# Altium integrated library FPC_Connector.IntLib: 212 symbols (part 1 of 2) (continued)
## 686124148922 (continued)
SMT ZIF Horizontal - Bottom Contact - 1.00 mm Hinge Type - WR-FPC, 24 pins; Part Number: 686124148922; Pitch: 1 mm; Pin Number: 24; ComponentLink1Description: Manufacturer; ComponentLink1URL: http://www.we-online.de; ComponentLink2Description: Datasheet; ComponentLink2URL: http://katalog.we-online.com/em/datasheet/6861xx148922.pdf; Published Date: April 2017; Publisher: Wurth Elektronik
footprint 686124148922 (SMT ZIF Horizontal - Bottom Contact - 1.00 mm Hinge Type, 24p)
pins: 1, 2, 3, 4, 5, 6, 7, 8, 9, 10, 11, 12, 13, 14, 15, 16, 17, 18, 19, 20, 21, 22, 23, 24

## 686126148922
designator J?
SMT ZIF Horizontal - Bottom Contact - 1.00 mm Hinge Type - WR-FPC, 26 pins; Part Number: 686126148922; Pitch: 1 mm; Pin Number: 26; ComponentLink1Description: Manufacturer; ComponentLink1URL: http://www.we-online.de; ComponentLink2Description: Datasheet; ComponentLink2URL: http://katalog.we-online.com/em/datasheet/6861xx148922.pdf; Published Date: April 2017; Publisher: Wurth Elektronik
footprint 686126148922 (SMT ZIF Horizontal - Bottom Contact - 1.00 mm Hinge Type, 26p)
pins: 1, 2, 3, 4, 5, 6, 7, 8, 9, 10, 11, 12, 13, 14, 15, 16, 17, 18, 19, 20, 21, 22, 23, 24, 25, 26

## 686128148922
designator J?
SMT ZIF Horizontal - Bottom Contact - 1.00 mm Hinge Type - WR-FPC, 28 pins; Part Number: 686128148922; Pitch: 1 mm; Pin Number: 28; ComponentLink1Description: Manufacturer; ComponentLink1URL: http://www.we-online.de; ComponentLink2Description: Datasheet; ComponentLink2URL: http://katalog.we-online.com/em/datasheet/6861xx148922.pdf; Published Date: April 2017; Publisher: Wurth Elektronik
footprint 686128148922 (SMT ZIF Horizontal - Bottom Contact - 1.00 mm Hinge Type, 28p)
pins: 1, 2, 3, 4, 5, 6, 7, 8, 9, 10, 11, 12, 13, 14, 15, 16, 17, 18, 19, 20, 21, 22, 23, 24, 25, 26, 27, 28

## 686130148922
designator J?
SMT ZIF Horizontal - Bottom Contact - 1.00 mm Hinge Type - WR-FPC, 30 pins; Part Number: 686130148922; Pitch: 1 mm; Pin Number: 30; ComponentLink1Description: Manufacturer; ComponentLink1URL: http://www.we-online.de; ComponentLink2Description: Datasheet; ComponentLink2URL: http://katalog.we-online.com/em/datasheet/6861xx148922.pdf; Published Date: April 2017; Publisher: Wurth Elektronik
footprint 686130148922 (SMT ZIF Horizontal - Bottom Contact - 1.00 mm Hinge Type, 30p)
pins: 1, 2, 3, 4, 5, 6, 7, 8, 9, 10, 11, 12, 13, 14, 15, 16, 17, 18, 19, 20, 21, 22, 23, 24, 25, 26, 27, 28, 29, 30


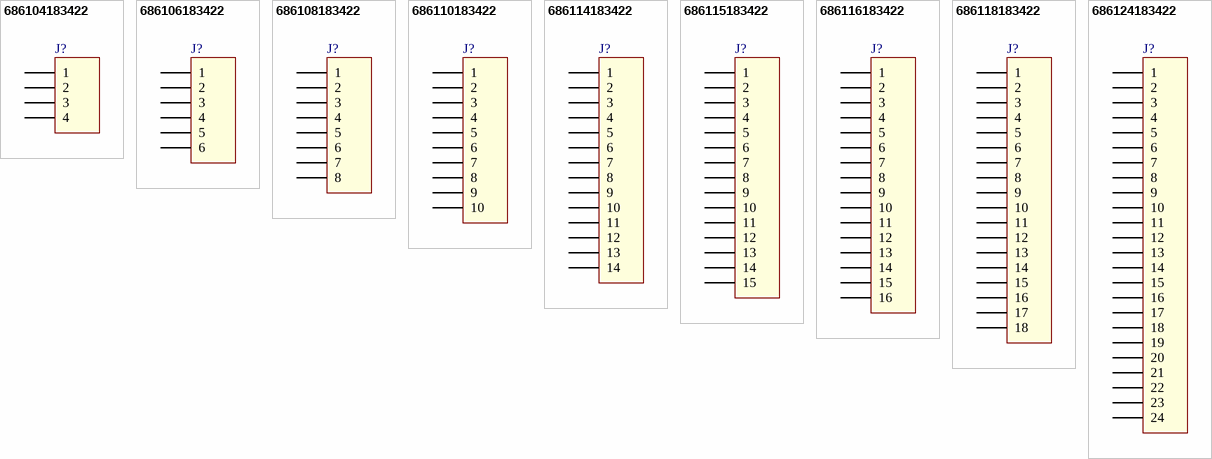
[diagram p3: symbols 686104183422 to 686124183422]

## 686104183422
designator J?
1.00 mm SMT Horizontal Top Contact - Low Profile WR-FPC, 4 pins; Part Number: 686104183422; Pitch: 1 mm; Pin Number: 4; ComponentLink1Description: Manufacturer; ComponentLink1URL: http://www.we-online.de; ComponentLink2Description: Datasheet; ComponentLink2URL: http://katalog.we-online.com/em/datasheet/686104183422.pdf; Published Date: April 2017; Publisher: Wurth Elektronik
footprint 686104183422 (1.00 mm SMT Horizontal Top Contact - Low Profile, 4p)
pins: 1, 2, 3, 4

## 686106183422
designator J?
1.00 mm SMT Horizontal Top Contact - Low Profile WR-FPC, 6 pins; Part Number: 686106183422; Pitch: 1 mm; Pin Number: 6; ComponentLink1Description: Manufacturer; ComponentLink1URL: http://www.we-online.de; ComponentLink2Description: Datasheet; ComponentLink2URL: http://katalog.we-online.com/em/datasheet/686106183422.pdf; Published Date: April 2017; Publisher: Wurth Elektronik
footprint 686106183422 (1.00 mm SMT Horizontal Top Contact - Low Profile, 6p)
pins: 1, 2, 3, 4, 5, 6

## 686108183422
designator J?
1.00 mm SMT Horizontal Top Contact - Low Profile WR-FPC, 8 pins; Part Number: 686108183422; Pitch: 1 mm; Pin Number: 8; ComponentLink1Description: Manufacturer; ComponentLink1URL: http://www.we-online.de; ComponentLink2Description: Datasheet; ComponentLink2URL: http://katalog.we-online.com/em/datasheet/686108183422.pdf; Published Date: April 2017; Publisher: Wurth Elektronik
footprint 686108183422 (1.00 mm SMT Horizontal Top Contact - Low Profile, 8p)
pins: 1, 2, 3, 4, 5, 6, 7, 8

## 686110183422
designator J?
1.00 mm SMT Horizontal Top Contact - Low Profile WR-FPC, 10 pins; Part Number: 686110183422; Pitch: 1 mm; Pin Number: 10; ComponentLink1Description: Manufacturer; ComponentLink1URL: http://www.we-online.de; ComponentLink2Description: Datasheet; ComponentLink2URL: http://katalog.we-online.com/em/datasheet/686110183422.pdf; Published Date: April 2017; Publisher: Wurth Elektronik
footprint 686110183422 (1.00 mm SMT Horizontal Top Contact - Low Profile, 10p)
pins: 1, 2, 3, 4, 5, 6, 7, 8, 9, 10

## 686114183422
designator J?
1.00 mm SMT Horizontal Top Contact - Low Profile WR-FPC, 14 pins; Part Number: 686114183422; Pitch: 1 mm; Pin Number: 14; ComponentLink1Description: Manufacturer; ComponentLink1URL: http://www.we-online.de; ComponentLink2Description: Datasheet; ComponentLink2URL: http://katalog.we-online.com/em/datasheet/686114183422.pdf; Published Date: April 2017; Publisher: Wurth Elektronik
footprint 686114183422 (1.00 mm SMT Horizontal Top Contact - Low Profile, 14p)
pins: 1, 2, 3, 4, 5, 6, 7, 8, 9, 10, 11, 12, 13, 14

## 686115183422
designator J?
1.00 mm SMT Horizontal Top Contact - Low Profile WR-FPC, 15 pins; Part Number: 686115183422; Pitch: 1 mm; Pin Number: 15; ComponentLink1Description: Manufacturer; ComponentLink1URL: http://www.we-online.de; ComponentLink2Description: Datasheet; ComponentLink2URL: http://katalog.we-online.com/em/datasheet/686115183422.pdf; Published Date: April 2017; Publisher: Wurth Elektronik
footprint 686115183422 (1.00 mm SMT Horizontal Top Contact - Low Profile, 15p)
pins: 1, 2, 3, 4, 5, 6, 7, 8, 9, 10, 11, 12, 13, 14, 15

## 686116183422
designator J?
1.00 mm SMT Horizontal Top Contact - Low Profile WR-FPC, 16 pins; Part Number: 686116183422; Pitch: 1 mm; Pin Number: 16; ComponentLink1Description: Manufacturer; ComponentLink1URL: http://www.we-online.de; ComponentLink2Description: Datasheet; ComponentLink2URL: http://katalog.we-online.com/em/datasheet/686116183422.pdf; Published Date: April 2017; Publisher: Wurth Elektronik
footprint 686116183422 (1.00 mm SMT Horizontal Top Contact - Low Profile, 16p)
pins: 1, 2, 3, 4, 5, 6, 7, 8, 9, 10, 11, 12, 13, 14, 15, 16

## 686118183422
designator J?
1.00 mm SMT Horizontal Top Contact - Low Profile WR-FPC, 18 pins; Part Number: 686118183422; Pitch: 1 mm; Pin Number: 18; ComponentLink1Description: Manufacturer; ComponentLink1URL: http://www.we-online.de; ComponentLink2Description: Datasheet; ComponentLink2URL: http://katalog.we-online.com/em/datasheet/686118183422.pdf; Published Date: April 2017; Publisher: Wurth Elektronik
footprint 686118183422 (1.00 mm SMT Horizontal Top Contact - Low Profile, 18p)
pins: 1, 2, 3, 4, 5, 6, 7, 8, 9, 10, 11, 12, 13, 14, 15, 16, 17, 18

## 686124183422
designator J?
1.00 mm SMT Horizontal Top Contact - Low Profile WR-FPC, 24 pins; Part Number: 686124183422; Pitch: 1 mm; Pin Number: 24; ComponentLink1Description: Manufacturer; ComponentLink1URL: http://www.we-online.de; ComponentLink2Description: Datasheet; ComponentLink2URL: http://katalog.we-online.com/em/datasheet/686124183422.pdf; Published Date: April 2017; Publisher: Wurth Elektronik
footprint 686124183422 (1.00 mm SMT Horizontal Top Contact - Low Profile, 24p)
pins: 1, 2, 3, 4, 5, 6, 7, 8, 9, 10, 11, 12, 13, 14, 15, 16, 17, 18, 19, 20, 21, 22, 23, 24


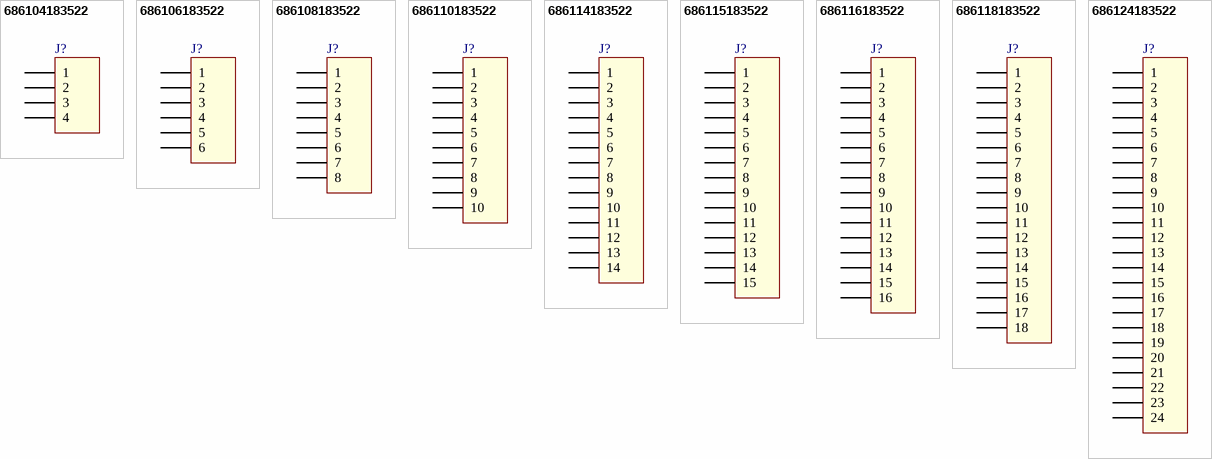
[diagram p4: symbols 686104183522 to 686124183522]

## 686104183522
designator J?
1.00 mm SMT Horizontal Bottom Contact - Low Profile WR-FPC, 4 pins; Part Number: 686104183522; Pitch: 1 mm; Pin Number: 4; ComponentLink1Description: Manufacturer; ComponentLink1URL: http://www.we-online.de; ComponentLink2Description: Datasheet; ComponentLink2URL: http://katalog.we-online.com/em/datasheet/686104183522.pdf; Published Date: April 2017; Publisher: Wurth Elektronik
footprint 686104183522 (1.00 mm SMT Horizontal Bottom Contact - Low Profile, 4p)
pins: 1, 2, 3, 4

## 686106183522
designator J?
1.00 mm SMT Horizontal Bottom Contact - Low Profile WR-FPC, 6 pins; Part Number: 686106183522; Pitch: 1 mm; Pin Number: 6; ComponentLink1Description: Manufacturer; ComponentLink1URL: http://www.we-online.de; ComponentLink2Description: Datasheet; ComponentLink2URL: http://katalog.we-online.com/em/datasheet/686106183522.pdf; Published Date: April 2017; Publisher: Wurth Elektronik
footprint 686106183522 (1.00 mm SMT Horizontal Bottom Contact - Low Profile, 6p)
pins: 1, 2, 3, 4, 5, 6

## 686108183522
designator J?
1.00 mm SMT Horizontal Bottom Contact - Low Profile WR-FPC, 8 pins; Part Number: 686108183522; Pitch: 1 mm; Pin Number: 8; ComponentLink1Description: Manufacturer; ComponentLink1URL: http://www.we-online.de; ComponentLink2Description: Datasheet; ComponentLink2URL: http://katalog.we-online.com/em/datasheet/686108183522.pdf; Published Date: April 2017; Publisher: Wurth Elektronik
footprint 686108183522 (1.00 mm SMT Horizontal Bottom Contact - Low Profile, 8p)
pins: 1, 2, 3, 4, 5, 6, 7, 8

## 686110183522
designator J?
1.00 mm SMT Horizontal Bottom Contact - Low Profile WR-FPC, 10 pins; Part Number: 686110183522; Pitch: 1 mm; Pin Number: 10; ComponentLink1Description: Manufacturer; ComponentLink1URL: http://www.we-online.de; ComponentLink2Description: Datasheet; ComponentLink2URL: http://katalog.we-online.com/em/datasheet/686110183522.pdf; Published Date: April 2017; Publisher: Wurth Elektronik
footprint 686110183522 (1.00 mm SMT Horizontal Bottom Contact - Low Profile, 10p)
pins: 1, 2, 3, 4, 5, 6, 7, 8, 9, 10

## 686114183522
designator J?
1.00 mm SMT Horizontal Bottom Contact - Low Profile WR-FPC, 14 pins; Part Number: 686114183522; Pitch: 1 mm; Pin Number: 14; ComponentLink1Description: Manufacturer; ComponentLink1URL: http://www.we-online.de; ComponentLink2Description: Datasheet; ComponentLink2URL: http://katalog.we-online.com/em/datasheet/686114183522.pdf; Published Date: April 2017; Publisher: Wurth Elektronik
footprint 686114183522 (1.00 mm SMT Horizontal Bottom Contact - Low Profile, 14p)
pins: 1, 2, 3, 4, 5, 6, 7, 8, 9, 10, 11, 12, 13, 14

## 686115183522
designator J?
1.00 mm SMT Horizontal Bottom Contact - Low Profile WR-FPC, 15 pins; Part Number: 686115183522; Pitch: 1 mm; Pin Number: 15; ComponentLink1Description: Manufacturer; ComponentLink1URL: http://www.we-online.de; ComponentLink2Description: Datasheet; ComponentLink2URL: http://katalog.we-online.com/em/datasheet/686115183522.pdf; Published Date: April 2017; Publisher: Wurth Elektronik
footprint 686115183522 (1.00 mm SMT Horizontal Bottom Contact - Low Profile, 15p)
pins: 1, 2, 3, 4, 5, 6, 7, 8, 9, 10, 11, 12, 13, 14, 15

## 686116183522
designator J?
1.00 mm SMT Horizontal Bottom Contact - Low Profile WR-FPC, 16 pins; Part Number: 686116183522; Pitch: 1 mm; Pin Number: 16; ComponentLink1Description: Manufacturer; ComponentLink1URL: http://www.we-online.de; ComponentLink2Description: Datasheet; ComponentLink2URL: http://katalog.we-online.com/em/datasheet/686116183522.pdf; Published Date: April 2017; Publisher: Wurth Elektronik
footprint 686116183522 (1.00 mm SMT Horizontal Bottom Contact - Low Profile, 16p)
pins: 1, 2, 3, 4, 5, 6, 7, 8, 9, 10, 11, 12, 13, 14, 15, 16

## 686118183522
designator J?
1.00 mm SMT Horizontal Bottom Contact - Low Profile WR-FPC, 18 pins; Part Number: 686118183522; Pitch: 1 mm; Pin Number: 18; ComponentLink1Description: Manufacturer; ComponentLink1URL: http://www.we-online.de; ComponentLink2Description: Datasheet; ComponentLink2URL: http://katalog.we-online.com/em/datasheet/686118183522.pdf; Published Date: April 2017; Publisher: Wurth Elektronik
footprint 686118183522 (1.00 mm SMT Horizontal Bottom Contact - Low Profile, 18p)
pins: 1, 2, 3, 4, 5, 6, 7, 8, 9, 10, 11, 12, 13, 14, 15, 16, 17, 18

## 686124183522
designator J?
1.00 mm SMT Horizontal Bottom Contact - Low Profile WR-FPC, 24 pins; Part Number: 686124183522; Pitch: 1 mm; Pin Number: 24; ComponentLink1Description: Manufacturer; ComponentLink1URL: http://www.we-online.de; ComponentLink2Description: Datasheet; ComponentLink2URL: http://katalog.we-online.com/em/datasheet/686124183522.pdf; Published Date: April 2017; Publisher: Wurth Elektronik
footprint 686124183522 (1.00 mm SMT Horizontal Bottom Contact - Low Profile, 24p)
pins: 1, 2, 3, 4, 5, 6, 7, 8, 9, 10, 11, 12, 13, 14, 15, 16, 17, 18, 19, 20, 21, 22, 23, 24


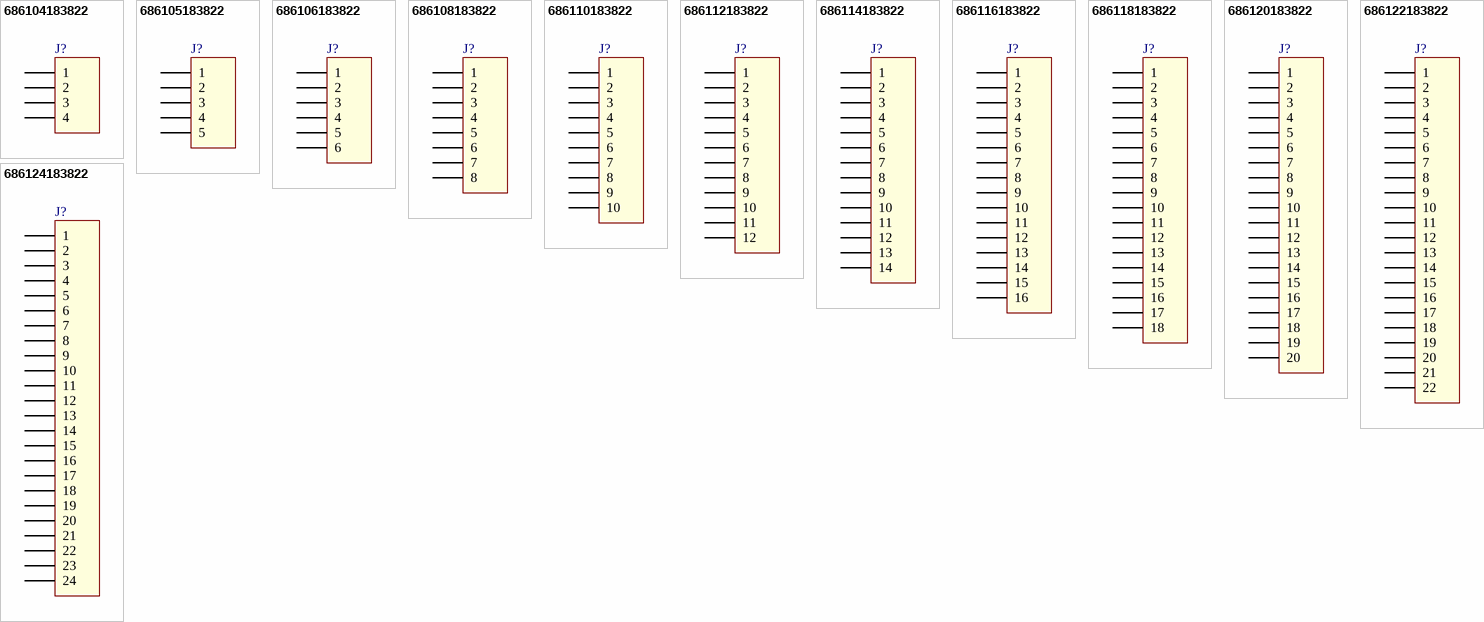
[diagram p5: symbols 686104183822 to 686124183822]

## 686104183822
designator J?
1.00 mm SMT ZIF Vertical Type A WR-FPC, 4 pins; Part Number: 686104183822; Pitch: 1 mm; Pin Number: 4; ComponentLink1Description: Manufacturer; ComponentLink1URL: http://www.we-online.de; ComponentLink2Description: Datasheet; ComponentLink2URL: http://katalog.we-online.com/em/datasheet/686104183822.pdf; Published Date: April 2017; Publisher: Wurth Elektronik
footprint 686104183822 (1.00 mm SMT ZIF Vertical Type A, 4p)
pins: 1, 2, 3, 4

## 686105183822
designator J?
1.00 mm SMT ZIF Vertical Type A WR-FPC, 5 pins; Part Number: 686105183822; Pitch: 1 mm; Pin Number: 5; ComponentLink1Description: Manufacturer; ComponentLink1URL: http://www.we-online.de; ComponentLink2Description: Datasheet; ComponentLink2URL: http://katalog.we-online.com/em/datasheet/686105183822.pdf; Published Date: April 2017; Publisher: Wurth Elektronik
footprint 686105183822 (1.00 mm SMT ZIF Vertical Type A, 5p)
pins: 1, 2, 3, 4, 5

## 686106183822
designator J?
1.00 mm SMT ZIF Vertical Type A WR-FPC, 6 pins; Part Number: 686106183822; Pitch: 1 mm; Pin Number: 6; ComponentLink1Description: Manufacturer; ComponentLink1URL: http://www.we-online.de; ComponentLink2Description: Datasheet; ComponentLink2URL: http://katalog.we-online.com/em/datasheet/686106183822.pdf; Published Date: April 2017; Publisher: Wurth Elektronik
footprint 686106183822 (1.00 mm SMT ZIF Vertical Type A, 6p)
pins: 1, 2, 3, 4, 5, 6

## 686108183822
designator J?
1.00 mm SMT ZIF Vertical Type A WR-FPC, 8 pins; Part Number: 686108183822; Pitch: 1 mm; Pin Number: 8; ComponentLink1Description: Manufacturer; ComponentLink1URL: http://www.we-online.de; ComponentLink2Description: Datasheet; ComponentLink2URL: http://katalog.we-online.com/em/datasheet/686108183822.pdf; Published Date: April 2017; Publisher: Wurth Elektronik
footprint 686108183822 (1.00 mm SMT ZIF Vertical Type A, 8p)
pins: 1, 2, 3, 4, 5, 6, 7, 8

## 686110183822
designator J?
1.00 mm SMT ZIF Vertical Type A WR-FPC, 10 pins; Part Number: 686110183822; Pitch: 1 mm; Pin Number: 10; ComponentLink1Description: Manufacturer; ComponentLink1URL: http://www.we-online.de; ComponentLink2Description: Datasheet; ComponentLink2URL: http://katalog.we-online.com/em/datasheet/686110183822.pdf; Published Date: April 2017; Publisher: Wurth Elektronik
footprint 686110183822 (1.00 mm SMT ZIF Vertical Type A, 10p)
pins: 1, 2, 3, 4, 5, 6, 7, 8, 9, 10

## 686112183822
designator J?
1.00 mm SMT ZIF Vertical Type A WR-FPC, 12 pins; Part Number: 686112183822; Pitch: 1 mm; Pin Number: 12; ComponentLink1Description: Manufacturer; ComponentLink1URL: http://www.we-online.de; ComponentLink2Description: Datasheet; ComponentLink2URL: http://katalog.we-online.com/em/datasheet/686112183822.pdf; Published Date: April 2017; Publisher: Wurth Elektronik
footprint 686112183822 (1.00 mm SMT ZIF Vertical Type A, 12p)
pins: 1, 2, 3, 4, 5, 6, 7, 8, 9, 10, 11, 12

## 686114183822
designator J?
1.00 mm SMT ZIF Vertical Type A WR-FPC, 14 pins; Part Number: 686114183822; Pitch: 1 mm; Pin Number: 14; ComponentLink1Description: Manufacturer; ComponentLink1URL: http://www.we-online.de; ComponentLink2Description: Datasheet; ComponentLink2URL: http://katalog.we-online.com/em/datasheet/686114183822.pdf; Published Date: April 2017; Publisher: Wurth Elektronik
footprint 686114183822 (1.00 mm SMT ZIF Vertical Type A, 14p)
pins: 1, 2, 3, 4, 5, 6, 7, 8, 9, 10, 11, 12, 13, 14

## 686116183822
designator J?
1.00 mm SMT ZIF Vertical Type A WR-FPC, 16 pins; Part Number: 686116183822; Pitch: 1 mm; Pin Number: 16; ComponentLink1Description: Manufacturer; ComponentLink1URL: http://www.we-online.de; ComponentLink2Description: Datasheet; ComponentLink2URL: http://katalog.we-online.com/em/datasheet/686116183822.pdf; Published Date: April 2017; Publisher: Wurth Elektronik
footprint 686116183822 (1.00 mm SMT ZIF Vertical Type A, 16p)
pins: 1, 2, 3, 4, 5, 6, 7, 8, 9, 10, 11, 12, 13, 14, 15, 16

## 686118183822
designator J?
1.00 mm SMT ZIF Vertical Type A WR-FPC, 18 pins; Part Number: 686118183822; Pitch: 1 mm; Pin Number: 18; ComponentLink1Description: Manufacturer; ComponentLink1URL: http://www.we-online.de; ComponentLink2Description: Datasheet; ComponentLink2URL: http://katalog.we-online.com/em/datasheet/686118183822.pdf; Published Date: April 2017; Publisher: Wurth Elektronik
footprint 686118183822 (1.00 mm SMT ZIF Vertical Type A, 18p)
pins: 1, 2, 3, 4, 5, 6, 7, 8, 9, 10, 11, 12, 13, 14, 15, 16, 17, 18

## 686120183822
designator J?
1.00 mm SMT ZIF Vertical Type A WR-FPC, 20 pins; Part Number: 686120183822; Pitch: 1 mm; Pin Number: 20; ComponentLink1Description: Manufacturer; ComponentLink1URL: http://www.we-online.de; ComponentLink2Description: Datasheet; ComponentLink2URL: http://katalog.we-online.com/em/datasheet/686120183822.pdf; Published Date: April 2017; Publisher: Wurth Elektronik
footprint 686120183822 (1.00 mm SMT ZIF Vertical Type A, 20p)
pins: 1, 2, 3, 4, 5, 6, 7, 8, 9, 10, 11, 12, 13, 14, 15, 16, 17, 18, 19, 20

## 686122183822
designator J?
1.00 mm SMT ZIF Vertical Type A WR-FPC, 22 pins; Part Number: 686122183822; Pitch: 1 mm; Pin Number: 22; ComponentLink1Description: Manufacturer; ComponentLink1URL: http://www.we-online.de; ComponentLink2Description: Datasheet; ComponentLink2URL: http://katalog.we-online.com/em/datasheet/686122183822.pdf; Published Date: April 2017; Publisher: Wurth Elektronik
footprint 686122183822 (1.00 mm SMT ZIF Vertical Type A, 22p)
pins: 1, 2, 3, 4, 5, 6, 7, 8, 9, 10, 11, 12, 13, 14, 15, 16, 17, 18, 19, 20, 21, 22

## 686124183822
designator J?
1.00 mm SMT ZIF Vertical Type A WR-FPC, 24 pins; Part Number: 686124183822; Pitch: 1 mm; Pin Number: 24; ComponentLink1Description: Manufacturer; ComponentLink1URL: http://www.we-online.de; ComponentLink2Description: Datasheet; ComponentLink2URL: http://katalog.we-online.com/em/datasheet/686124183822.pdf; Published Date: April 2017; Publisher: Wurth Elektronik
footprint 686124183822 (1.00 mm SMT ZIF Vertical Type A, 24p)
pins: 1, 2, 3, 4, 5, 6, 7, 8, 9, 10, 11, 12, 13, 14, 15, 16, 17, 18, 19, 20, 21, 22, 23, 24


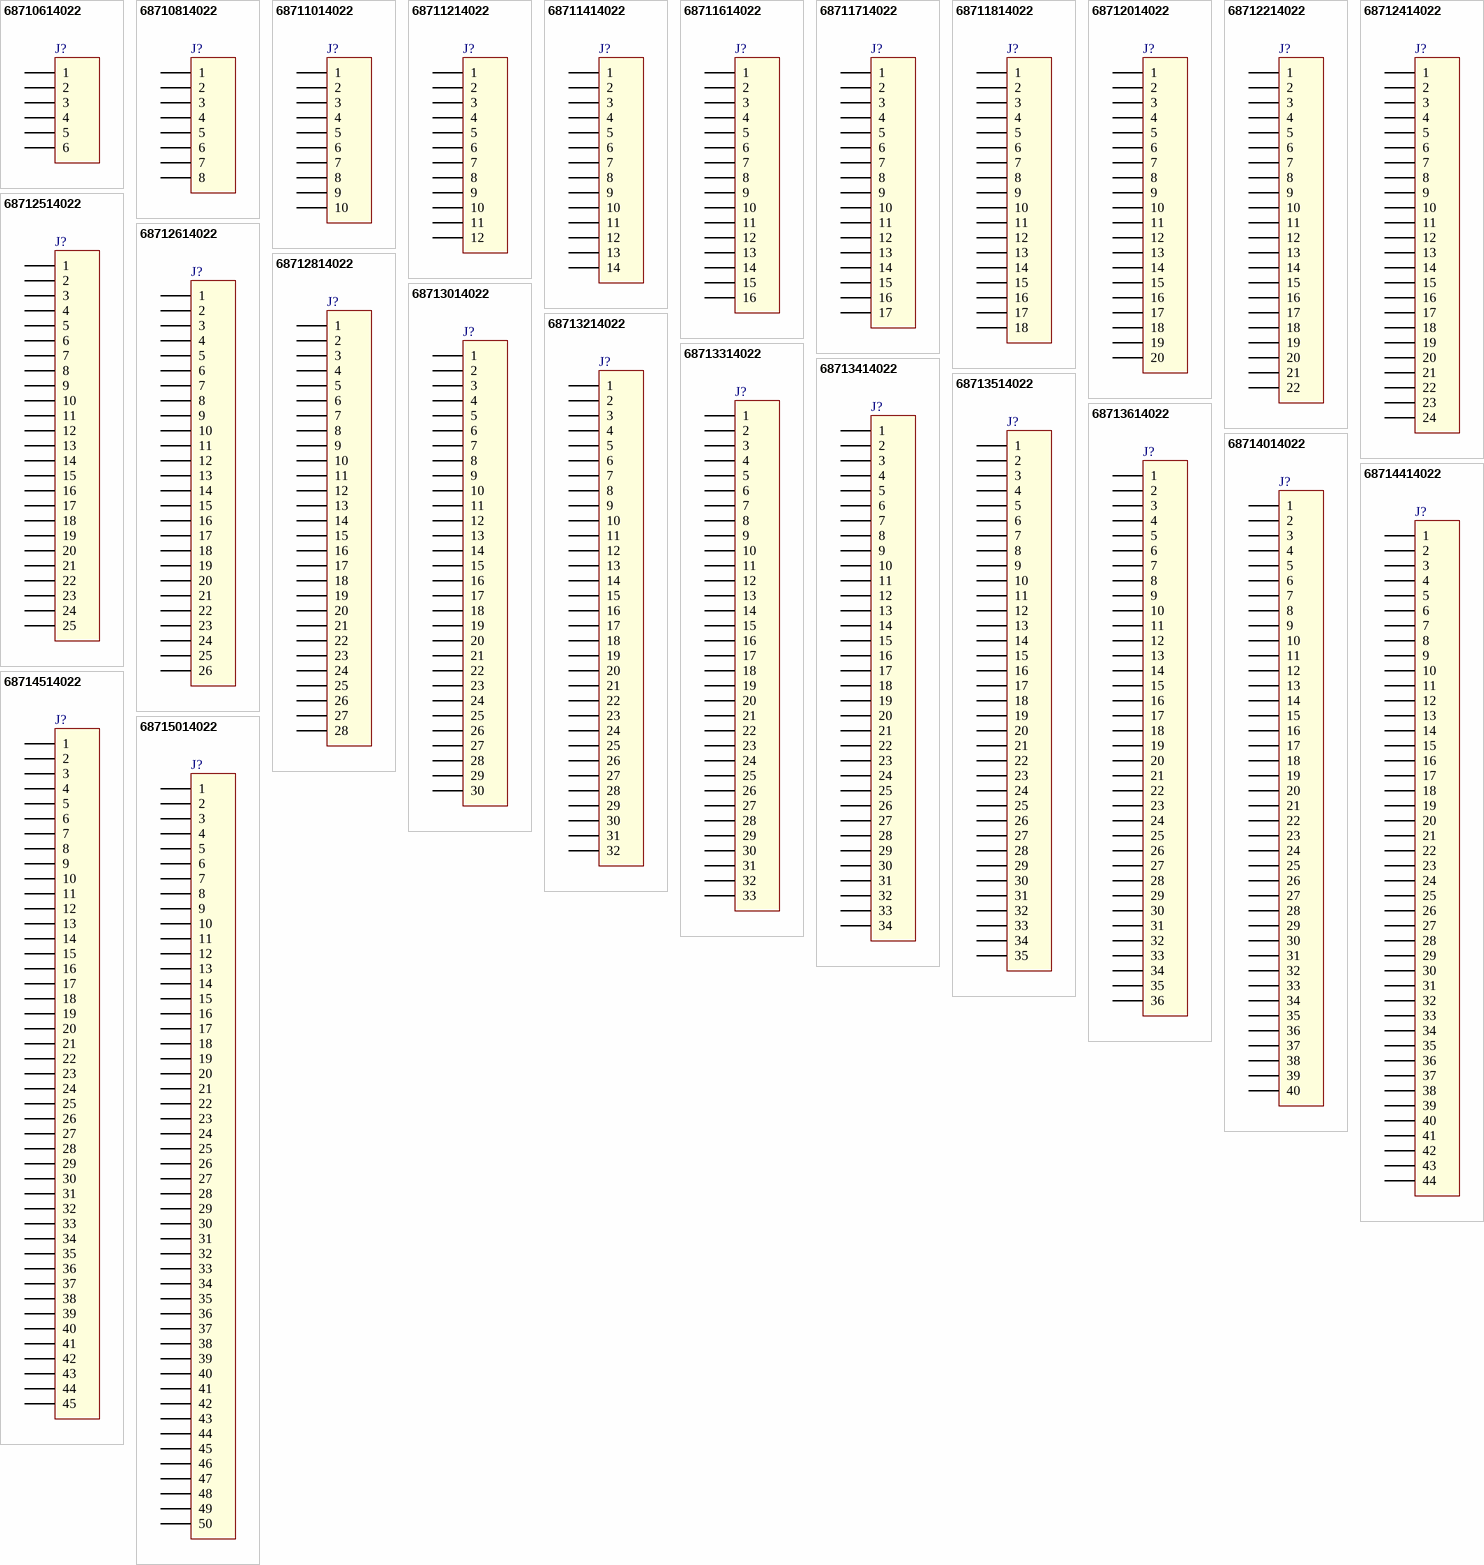
[diagram p6: symbols 68710614022 to 68715014022]

## 68710614022
designator J?
0.50 mm SMT ZIF Horizontal Top Contact WR-FPC, 6 pins; Part Number: 68710614022; Pitch: 0.5 mm; Pin Number: 6; ComponentLink1Description: Manufacturer; ComponentLink1URL: http://www.we-online.de; ComponentLink2Description: Datasheet; ComponentLink2URL: http://katalog.we-online.com/em/datasheet/6871xx14022.pdf; Published Date: April 2017; Publisher: Wurth Elektronik
footprint 68710614022 (0.50 mm SMT ZIF Horizontal Top Contact, 6p)
pins: 1, 2, 3, 4, 5, 6

## 68710814022
designator J?
0.50 mm SMT ZIF Horizontal Top Contact WR-FPC, 8 pins; Part Number: 68710814022; Pitch: 0.5 mm; Pin Number: 8; ComponentLink1Description: Manufacturer; ComponentLink1URL: http://www.we-online.de; ComponentLink2Description: Datasheet; ComponentLink2URL: http://katalog.we-online.com/em/datasheet/6871xx14022.pdf; Published Date: April 2017; Publisher: Wurth Elektronik
footprint 68710814022 (0.50 mm SMT ZIF Horizontal Top Contact, 8p)
pins: 1, 2, 3, 4, 5, 6, 7, 8

## 68711014022
designator J?
0.50 mm SMT ZIF Horizontal Top Contact WR-FPC, 10 pins; Part Number: 68711014022; Pitch: 0.5 mm; Pin Number: 10; ComponentLink1Description: Manufacturer; ComponentLink1URL: http://www.we-online.de; ComponentLink2Description: Datasheet; ComponentLink2URL: http://katalog.we-online.com/em/datasheet/6871xx14022.pdf; Published Date: April 2017; Publisher: Wurth Elektronik
footprint 68711014022 (0.50 mm SMT ZIF Horizontal Top Contact, 10p)
pins: 1, 2, 3, 4, 5, 6, 7, 8, 9, 10

## 68711214022
designator J?
0.50 mm SMT ZIF Horizontal Top Contact WR-FPC, 12 pins; Part Number: 68711214022; Pitch: 0.5 mm; Pin Number: 12; ComponentLink1Description: Manufacturer; ComponentLink1URL: http://www.we-online.de; ComponentLink2Description: Datasheet; ComponentLink2URL: http://katalog.we-online.com/em/datasheet/6871xx14022.pdf; Published Date: April 2017; Publisher: Wurth Elektronik
footprint 68711214022 (0.50 mm SMT ZIF Horizontal Top Contact, 12p)
pins: 1, 2, 3, 4, 5, 6, 7, 8, 9, 10, 11, 12

## 68711414022
designator J?
0.50 mm SMT ZIF Horizontal Top Contact WR-FPC, 14 pins; Part Number: 68711414022; Pitch: 0.5 mm; Pin Number: 14; ComponentLink1Description: Manufacturer; ComponentLink1URL: http://www.we-online.de; ComponentLink2Description: Datasheet; ComponentLink2URL: http://katalog.we-online.com/em/datasheet/6871xx14022.pdf; Published Date: April 2017; Publisher: Wurth Elektronik
footprint 68711414022 (0.50 mm SMT ZIF Horizontal Top Contact, 14p)
pins: 1, 2, 3, 4, 5, 6, 7, 8, 9, 10, 11, 12, 13, 14

## 68711614022
designator J?
0.50 mm SMT ZIF Horizontal Top Contact WR-FPC, 16 pins; Part Number: 68711614022; Pitch: 0.5 mm; Pin Number: 16; ComponentLink1Description: Manufacturer; ComponentLink1URL: http://www.we-online.de; ComponentLink2Description: Datasheet; ComponentLink2URL: http://katalog.we-online.com/em/datasheet/6871xx14022.pdf; Published Date: April 2017; Publisher: Wurth Elektronik
footprint 68711614022 (0.50 mm SMT ZIF Horizontal Top Contact, 16p)
pins: 1, 2, 3, 4, 5, 6, 7, 8, 9, 10, 11, 12, 13, 14, 15, 16

## 68711714022
designator J?
0.50 mm SMT ZIF Horizontal Top Contact WR-FPC, 17 pins; Part Number: 68711714022; Pitch: 0.5 mm; Pin Number: 17; ComponentLink1Description: Manufacturer; ComponentLink1URL: http://www.we-online.de; ComponentLink2Description: Datasheet; ComponentLink2URL: http://katalog.we-online.com/em/datasheet/6871xx14022.pdf; Published Date: April 2017; Publisher: Wurth Elektronik
footprint 68711714022 (0.50 mm SMT ZIF Horizontal Top Contact, 17p)
pins: 1, 2, 3, 4, 5, 6, 7, 8, 9, 10, 11, 12, 13, 14, 15, 16, 17
